# Altium schematic symbol library Schlib.SchLib: 725 symbols (part 5 of 6) (continued)
## TDZ3V6J,115
designator D?  (value not drawn)
Diode Zener Single 3.6V 2% 500mW Automotive 2-Pin SOD-323F T/R; Manufacturer: Nexperia; Manufacturer Part Number: TDZ3V6J,115; Supplier: Digi-Key; Supplier Part Number: 1727-1758-1-ND; RoHS: Yes; Category: Zener Diodes; Stock: 3257; Pricing: 1=0.34000, 10=0.28100, 100=0.14910, 500=0.09810, 1000=0.06671 (USD); RoHS Compliant: Yes; ComponentLink1URL: http://www.farnell.com/datasheets/1508366.pdf?src-supplier=Farnell; ComponentLink1Description: http://www.farnell.com/datasheets/1508366.pdf?src-supplier=Farnell; ComponentLink2URL: https://assets.nexperia.com/documents/data-sheet/TDZXJ_SER.pdf?src-supplier=Digi-Key; ComponentLink2Description: https://assets.nexperia.com/documents/data-sheet/TDZXJ_SER.pdf?src-supplier=Digi-Key; Value: 3.6V
footprint SC-90, SOD-323F
pins: 1 C, 2 A

## TDZ5V1J,115
designator D?  (value not drawn)
Diode Zener Single 5.1V 2% 500mW Automotive 2-Pin SOD-323F T/R; Manufacturer: Nexperia; Manufacturer Part Number: TDZ5V1J,115; Supplier: Digi-Key; Supplier Part Number: 1727-1761-1-ND; RoHS: Yes; Category: Zener Diodes; Stock: 14899; Pricing: 1=0.34000, 10=0.28100, 100=0.14910, 500=0.09810, 1000=0.06671 (USD); RoHS Compliant: Yes; ComponentLink1URL: http://www.farnell.com/datasheets/1508366.pdf?src-supplier=Farnell; ComponentLink1Description: http://www.farnell.com/datasheets/1508366.pdf?src-supplier=Farnell; ComponentLink2URL: https://www.mouser.com/ds/2/302/TDZXJ_SER-119854.pdf?src-supplier=Mouser; ComponentLink2Description: https://www.mouser.com/ds/2/302/TDZXJ_SER-119854.pdf?src-supplier=Mouser; Value: 5.1V; Case/Package: SOD-323F
footprint SC-90, SOD-323F
pins: 1 C, 2 A

## TDZ22J,115
designator D?  (value not drawn)
Diode Zener Single 22V 2% 500mW Automotive 2-Pin SOD-323F T/R; Manufacturer: NXP Semiconductors; Manufacturer Part Number: TDZ22J,115; Max Reverse Leakage Current: 15.4uA; Impedance: 25R; Supplier: Digi-Key; Supplier Part Number: TDZ22J,115-ND; RoHS: Yes; Category: Uncategorized; Mounting Technology: Surface Mount; Pins: 2; Min Operating Temperature: -55°C; Max Operating Temperature: 150°C; Max Power Dissipation: 500mW; Zener Voltage: 22V; Element Configuration: Single; Package Quantity: 3000; Tolerance: 2%; Packaging: Tape and Reel; Power Dissipation: 500mW; Voltage Tolerance: 2%; Radiation Hardening: No; RoHS Compliant: Yes; ComponentLink1URL: https://datasheet.ciiva.com/899/tdzxj-ser-899042.pdf?src-supplier=Digi-Key; ComponentLink1Description: https://datasheet.ciiva.com/899/tdzxj-ser-899042.pdf?src-supplier=Digi-Key; ComponentLink2URL: https://datasheet.ciiva.com/10645/tdzxj-ser-10645782.pdf?src-supplier=Avnet; ComponentLink2Description: https://datasheet.ciiva.com/10645/tdzxj-ser-10645782.pdf?src-supplier=Avnet; Value: 22V
footprint SC-90, SOD-323F
pins: 1 C, 2 A

## TE054003-5
designator BUZ?  (value not drawn)
Electro-mechanical Transducer; Manufacturer: DB Unlimited; Manufacturer Part Number: TE054003-5; Supplier 1: Digi-Key; Stock 1: 2000; Pricing 1: 1=1.49000, 10=1.24100, 25=1.14800, 50=1.08000, 100=1.01430, 500=0.87142, 1000=0.83790 (USD); Supplier Part Number 1: 2104-TE054003-5CT-ND
footprint TE054003-5 (DFN, 4-Leads, Body 5.50x5.50mm, Pitch 3.70mm, IPC Medium Density)
pins: 1 +, 2 -

## TL3330AF260QG
designator B?  (value not drawn)
Switch Tactile N.O. SPST Rectangular Button Gull Wing 0.05A 12VDC 2.55N SMD; Manufacturer: E-Switch; Manufacturer Part Number: TL3330AF260QG; Supplier: Future Electronics; Supplier Part Number: 5021134; RoHS: Yes; Category: Tactile Switches; Stock: 18400; Pricing: 2300=0.265, 4600=0.26, 6900=0.255, 9200=0.25 (USD); ComponentLink1URL: https://datasheet.ciiva.com/2900/p010951-2900788.pdf?src-supplier=Digi-Key; ComponentLink1Description: https://datasheet.ciiva.com/2900/p010951-2900788.pdf?src-supplier=Digi-Key; ComponentLink2URL: https://datasheet.ciiva.com/5284/tl3330-28043-5284129.pdf?src-supplier=Mouser; ComponentLink2Description: https://datasheet.ciiva.com/5284/tl3330-28043-5284129.pdf?src-supplier=Mouser; ComponentLink3URL: https://datasheet.ciiva.com/2900/tl3330-2900789.pdf?src-supplier=Digi-Key; ComponentLink3Description: https://datasheet.ciiva.com/2900/tl3330-2900789.pdf?src-supplier=Digi-Key; ComponentLink4URL: https://datasheet.ciiva.com/2900/tl3330-2900790.pdf?src-supplier=Digi-Key; ComponentLink4Description: https://datasheet.ciiva.com/2900/tl3330-2900790.pdf?src-supplier=Digi-Key
footprint TL3330AF260QG
pins: 1 NO_2, 2 COM_1, S1 NO_1, S2 COM_2

## TLJB157M010R0500
designator C?  value 150uF  (hidden comment: *)
Cap Tant Solid 150uF 10V B CASE 20% (3.5 X 2.8 X 1.9mm) Inward L SMD 3528-21 0.5 Ohm 125C T/R; Manufacturer: Kyocera AVX; Manufacturer Part Number: TLJB157M010R0500; Dielectric Material: Tantalum; ESR (Equivalent Series Resistance): 500mR; Ripple Current: 412mA; Leakage Current: 15uA; Polarity: Polar; Supplier: Digi-Key; Supplier Part Number: 478-3349-1-ND; RoHS: Yes; Category: Tantalum Capacitors; Stock: 229155; Pricing: 1=0.90000, 10=0.66000, 50=0.52760, 100=0.45220, 500=0.35802, 1000=0.30149 (USD); Mounting Technology: Surface Mount,PCB; Case/Package: 1210; Pins: 2; Case Code (Imperial): 1210; Case Code (Metric): 3528; Min Operating Temperature: -55°C; Max Operating Temperature: 125°C; Package Quantity: 2000; Voltage Rating: 10V; Tolerance: 20%; Packaging: Tape and Reel; Voltage Rating (DC): 10V; Termination: SMD/SMT; Voltage: 10V; Features: General Purpose; Series: TLJ; Construction: Flat; Length: 3.5mm; Width: 2.8mm; Height: 1.9mm; Height - Seated (Max): 0.083inch; Depth: 2.8mm; Lead Pitch: 1.4mm; Radiation Hardening: No; Reach SVHC Compliant: Yes; Lead Free: Lead Free; RoHS Compliant: Yes; ComponentLink1URL: https://datasheet.ciiva.com/264/tlj-264787.pdf?src-supplier=Digi-Key; ComponentLink1Description: https://datasheet.ciiva.com/264/tlj-264787.pdf?src-supplier=Digi-Key; ComponentLink2URL: https://datasheet.ciiva.com/46385/1910903-46385237.pdf?src-supplier=Element14; ComponentLink2Description: https://datasheet.ciiva.com/46385/1910903-46385237.pdf?src-supplier=Element14; ComponentLink3URL: https://datasheet.ciiva.com/11229/tlj-11229389.pdf?src-supplier=Avnet; ComponentLink3Description: https://datasheet.ciiva.com/11229/tlj-11229389.pdf?src-supplier=Avnet; ComponentLink4URL: https://datasheet.ciiva.com/264/tlj-264786.pdf?src-supplier=Digi-Key; ComponentLink4Description: https://datasheet.ciiva.com/264/tlj-264786.pdf?src-supplier=Digi-Key; ComponentLink5URL: https://datasheet.ciiva.com/28515/tlj-28515528.pdf?src-supplier=Element14; ComponentLink5Description: https://datasheet.ciiva.com/28515/tlj-28515528.pdf?src-supplier=Element14; ComponentLink6URL: https://datasheet.ciiva.com/14593/70001364-14593673.pdf?src-supplier=Allied+Electronics; ComponentLink6Description: https://datasheet.ciiva.com/14593/70001364-14593673.pdf?src-supplier=Allied+Electronics; ComponentLink7URL: https://datasheet.ciiva.com/264/tlj-264788.pdf?src-supplier=Digi-Key; ComponentLink7Description: https://datasheet.ciiva.com/264/tlj-264788.pdf?src-supplier=Digi-Key; ComponentLink8URL: https://datasheet.ciiva.com/7773/1533257-7773833.pdf?src-supplier=Element14; ComponentLink8Description: https://datasheet.ciiva.com/7773/1533257-7773833.pdf?src-supplier=Element14; ComponentLink9URL: https://datasheet.ciiva.com/14606/70001364-14606409.pdf?src-supplier=Allied+Electronics; ComponentLink9Description: https://datasheet.ciiva.com/14606/70001364-14606409.pdf?src-supplier=Allied+Electronics; ComponentLink10URL: https://datasheet.ciiva.com/7773/1533257-7773834.pdf?src-supplier=Element14; ComponentLink10Description: https://datasheet.ciiva.com/7773/1533257-7773834.pdf?src-supplier=Element14
footprint Tantal 1210 (Molded Capacitor, 2-Leads, Body 3.50x2.80mm, IPC Medium Density)
pins: 1 P, 2 N

## TLP2270(TP4,E
designator U?  (value not drawn)
Optocoupler Logic-Out Totem-Pole DC-IN 2-CH 8-Pin SOIC; Manufacturer: Toshiba; Manufacturer Part Number: TLP2270(TP4,E; Supplier: Avnet; Supplier Part Number: TLP2270(TP4,E; RoHS: Yes; Category: Optocouplers; Stock: 10500; Pricing: 1500=1.3311, 3000=1.2963, 6000=1.2354, 9000=1.2006, 12000=1.1745, 15000=1.1397, 150000=1.1136 (USD); RoHS Compliant: Yes
footprint TLP2270(TP4,E
pins: 1 A1, 2 C1, 3 C2, 4 A2, 5 GND, 6 Vo2, 7 Vo1, 8 VDD

## TLV3201AIDBVT
designator U?  (value not drawn)
5.5-V, high-speed, single push-pull comparator 5-SOT-23 -40 to 125; Manufacturer: Texas Instruments; Manufacturer Part Number: TLV3201AIDBVT; Manufacturer Lifecycle Status: ACTIVE; Common Mode Rejection Ratio: 70dB; Hysteresis: 1.2mV; Input Bias Current: 5nA; Input Offset Voltage (Vos): 5mV; Max Supply Current: 40µA; Max Supply Voltage: 5.5V; Min Supply Voltage: 2.7V; Nominal Supply Current: 50µA; Number of Channels: 1; Power Supply Rejection Ratio (PSRR): 85dB; Propagation Delay: 50ns; Response Time: 47ns; Supplier: Arrow Electronics; Supplier Part Number: TLV3201AIDBVT; RoHS: Compliant; Category: Amplifiers - Op Amps, Buffer, Instrumentation; Stock: 1; Pricing: 1=0.365 (USD); Case/Package: SOT-23; Contact Plating: Gold; Height: 1.45mm; Lead Free: Lead Free; Length: 2.9mm; Lifecycle Status: Production; Max Input Current: 5nA; Max Operating Temperature: 125°C; Min Operating Temperature: -40°C; Mounting Technology: Surface Mount; Number of Elements: 1; Pins: 5; Quiescent Current: 40µA; Radiation Hardening: No; REACH SVHC: No; Schedule B: 8542390000, 8542390000|8542390000, 8542390000|8542390000|8542390000, 8542390000|8542390000|8542390000|8542390000; Thickness: 1.2mm; Type: General Purpose; Width: 1.6mm; ComponentLink1URL: https://sigma.octopart.com:443/177332311/technical_drawing/Texas-Instruments-TLV3201AIDBVT.pdf?src-supplier=Texas+Instruments; ComponentLink1Description: https://sigma.octopart.com:443/177332311/technical_drawing/Texas-Instruments-TLV3201AIDBVT.pdf?src-supplier=Texas+Instruments; ComponentLink2URL: https://octopart.com:443/opatz8j6/c1?t=2vYj1qybP85R42PSUDwDONm9QTJGmWWDeqlWX6R7n31u9wp2wYqVPtCHbjylz0xekjg_po4rVVa2AwJl8eWf1XKT56o8-lWyjI0WNm2mqUuIXo78aiM58K-f9u1mjfwqEZY4xTxthA6dd2om9C-s-SpA86zAToBfNtxMXduUy7wlH0rrFj5KFPvfMwEV85eJP5rY-7yR8Qg0X9Ri0bG1n0PE1KqX8jMBPC0_6-OxyZrXZehNzqgP8dyogx5HXmVuMmjHJpQkbYRuhgu-Gy9h0rVT5CcMvtcKT2BoMGEwKJ6R-eLAXsUSmnhfCEBvvW92J-UEmyxkzSUUTNRf0S9Cx_50D-GzlCMd3JnSMazxJtNHUhhnY62JbgKdMxTJjs-ZCDAjAhM&src-supplier=Texas+Instruments; ComponentLink2Description: https://octopart.com:443/opatz8j6/c1?t=2vYj1qybP85R42PSUDwDONm9QTJGmWWDeqlWX6R7n31u9wp2wYqVPtCHbjylz0xekjg_po4rVVa2AwJl8eWf1XKT56o8-lWyjI0WNm2mqUuIXo78aiM58K-f9u1mjfwqEZY4xTxthA6dd2om9C-s-SpA86zAToBfNtxMXduUy7wlH0rrFj5KFPvfMwEV85eJP5rY-7yR8Qg0X9Ri0bG1n0PE1KqX8jMBPC0_6-OxyZrXZehNzqgP8dyogx5HXmVuMmjHJpQkbYRuhgu-Gy9h0rVT5CcMvtcKT2BoMGEwKJ6R-eLAXsUSmnhfCEBvvW92J-UEmyxkzSUUTNRf0S9Cx_50D-GzlCMd3JnSMazxJtNHUhhnY62JbgKdMxTJjs-ZCDAjAhM&src-supplier=Texas+Instruments; ComponentLink3URL: https://sigma.octopart.com:443/175570406/technical_drawing/Texas-Instruments-TLV3201AIDBVT.pdf?src-supplier=Texas+Instruments; ComponentLink3Description: https://sigma.octopart.com:443/175570406/technical_drawing/Texas-Instruments-TLV3201AIDBVT.pdf?src-supplier=Texas+Instruments; ComponentLink4URL: https://sigma.octopart.com:443/169406034/technical_drawing/Texas-Instruments-TLV3201AIDBVT.pdf?src-supplier=Texas+Instruments; ComponentLink4Description: https://sigma.octopart.com:443/169406034/technical_drawing/Texas-Instruments-TLV3201AIDBVT.pdf?src-supplier=Texas+Instruments; ComponentLink5URL: https://sigma.octopart.com:443/155939316/technical_drawing/Texas-Instruments-TLV3201AIDBVT.pdf?src-supplier=Texas+Instruments; ComponentLink5Description: https://sigma.octopart.com:443/155939316/technical_drawing/Texas-Instruments-TLV3201AIDBVT.pdf?src-supplier=Texas+Instruments; ComponentLink6URL: https://sigma.octopart.com:443/102331370/technical_drawing/Texas-Instruments-TLV3201AIDBVT.pdf?src-supplier=Texas+Instruments; ComponentLink6Description: https://sigma.octopart.com:443/102331370/technical_drawing/Texas-Instruments-TLV3201AIDBVT.pdf?src-supplier=Texas+Instruments; ComponentLink7URL: https://sigma.octopart.com:443/49249325/technical_drawing/Texas-Instruments-TLV3201AIDBVT.pdf?src-supplier=Texas+Instruments; ComponentLink7Description: https://sigma.octopart.com:443/49249325/technical_drawing/Texas-Instruments-TLV3201AIDBVT.pdf?src-supplier=Texas+Instruments; ComponentLink8URL: https://datasheet.octopart.com:443/TLV3201AIDBVT-Texas-Instruments-datasheet-11515870.pdf?src-supplier=Texas+Instruments; ComponentLink8Description: https://datasheet.octopart.com:443/TLV3201AIDBVT-Texas-Instruments-datasheet-11515870.pdf?src-supplier=Texas+Instruments; ComponentLink9URL: https://datasheet.octopart.com:443/TLV3201AIDBVT-Texas-Instruments-datasheet-10947357.pdf?src-supplier=Texas+Instruments; ComponentLink9Description: https://datasheet.octopart.com:443/TLV3201AIDBVT-Texas-Instruments-datasheet-10947357.pdf?src-supplier=Texas+Instruments; ComponentLink10URL: https://datasheet.octopart.com:443/TLV3201AIDBVT-Texas-Instruments-datasheet-37140356.pdf?src-supplier=Farnell; ComponentLink10Description: https://datasheet.octopart.com:443/TLV3201AIDBVT-Texas-Instruments-datasheet-37140356.pdf?src-supplier=Farnell; ComponentLink11URL: https://datasheet.octopart.com:443/TLV3201AIDBVT-Texas-Instruments-datasheet-11761733.pdf?src-supplier=Newark; ComponentLink11Description: https://datasheet.octopart.com:443/TLV3201AIDBVT-Texas-Instruments-datasheet-11761733.pdf?src-supplier=Newark; ComponentLink12URL: https://datasheet.octopart.com:443/TLV3201AIDBVT-Texas-Instruments-datasheet-33022092.pdf?src-supplier=Newark; ComponentLink12Description: https://datasheet.octopart.com:443/TLV3201AIDBVT-Texas-Instruments-datasheet-33022092.pdf?src-supplier=Newark; ComponentLink13URL: https://datasheet.octopart.com:443/TLV3201AIDBVT-Texas-Instruments-datasheet-164418918.pdf?src-supplier=SHENGYU+ELECTRONICS; ComponentLink13Description: https://datasheet.octopart.com:443/TLV3201AIDBVT-Texas-Instruments-datasheet-164418918.pdf?src-supplier=SHENGYU+ELECTRONICS; ComponentLink14URL: https://datasheet.octopart.com:443/TLV3201AIDBVT-Texas-Instruments-datasheet-81455961.pdf?src-supplier=TME; ComponentLink14Description: https://datasheet.octopart.com:443/TLV3201AIDBVT-Texas-Instruments-datasheet-81455961.pdf?src-supplier=TME; ComponentLink15URL: http://sigma.octopart.com:80/reach_statement/Texas-Instruments-company-64.pdf?src-supplier=Compliance+Statements; ComponentLink15Description: http://sigma.octopart.com:80/reach_statement/Texas-Instruments-company-64.pdf?src-supplier=Compliance+Statements; ComponentLink16URL: http://sigma.octopart.com:80/conflict_mineral_statement/Texas-Instruments-company-63.pdf?src-supplier=Compliance+Statements; ComponentLink16Description: http://sigma.octopart.com:80/conflict_mineral_statement/Texas-Instruments-company-63.pdf?src-supplier=Compliance+Statements
footprint SOT-23-5
pins: 1, 2, 3, 4, 5
text: +; -

## TLV3201AIDCKT
designator U?  (value not drawn)
5.5-V, high-speed, single push-pull comparator 5-SC70 -40 to 125; Manufacturer: Texas Instruments; Manufacturer Part Number: TLV3201AIDCKT; Manufacturer Lifecycle Status: ACTIVE; Common Mode Rejection Ratio: 70dB; Hysteresis: 1.2mV; Input Bias Current: 1pA; Input Offset Voltage (Vos): 1mV; Max Dual Supply Voltage: 2.75V; Max Input Current: 5nA; Max Junction Temperature (Tj): 150°C; Max Supply Current: 40µA; Max Supply Voltage: 5.5V; Min Dual Supply Voltage: 1.35V; Min Supply Voltage: 2.7V; Nominal Supply Current: 50µA; Number of Channels: 1; Output Current per Channel: 48mA; Power Supply Rejection Ratio (PSRR): 85dB; Propagation Delay: 50ns; Response Time: 40ns; Supplier: Arrow Electronics; Supplier Part Number: TLV3201AIDCKT; RoHS: Compliant; Category: Comparators; Stock: 231; Pricing: 1=1.092, 10=0.928, 25=0.874, 100=0.734 (USD); Case/Package: SC; Contact Plating: Gold; Height: 1.1mm; Lead Free: Lead Free; Length: 2mm; Lifecycle Status: Production; Max Operating Temperature: 125°C; Min Operating Temperature: -40°C; Mounting Technology: Surface Mount; Number of Elements: 1; Pins: 5; Quiescent Current: 40µA; Radiation Hardening: No; REACH SVHC: No; Schedule B: 8542390000, 8542390000|8542390000|8542390000|8542390000|8542390000; Thickness: 900µm; Type: General Purpose; Width: 1.25mm; ComponentLink1URL: https://sigma.octopart.com:443/182282879/technical_drawing/Texas-Instruments-TLV3201AIDCKT.pdf?src-supplier=Texas+Instruments; ComponentLink1Description: https://sigma.octopart.com:443/182282879/technical_drawing/Texas-Instruments-TLV3201AIDCKT.pdf?src-supplier=Texas+Instruments; ComponentLink2URL: https://octopart.com:443/opatz8j6/c1?t=0YiOlHvn6IAuunCIKdjqF0B2t0hslJ71VHy3--cHUUZ8_1M2AdMluaXtAVOVTKRGTYLwvYVc6yZ3q_Bgg0GYQnVaPR5DUzvbeQyE5XtDVIeMgAY-jQ4PK7gzPZO7WtF2MNbyRsk84lRSyjoULzwiR04MWuOaW7u_0a6H-27epDdXQrynAdIx1htCieGeEd0lHGPyYj04cE5Evd5pVpesiYndIh2-tjM3Gsw7CV_nn6iuTa1MdqyOkGeJGHAM_U6d5M7Khs80HR5Wd8Gyc6q5yf0h6c1A1wpc7-SXCfgelJFNDYL9SWTIZV4JsLo2wQNnZ125CWNfldHyIF44bZjSHfhCkUtgmT7ktFHG6cLVoZ6QEJSe1KhGep6POxnYgz9jCgG-9y8&src-supplier=Texas+Instruments; ComponentLink2Description: https://octopart.com:443/opatz8j6/c1?t=0YiOlHvn6IAuunCIKdjqF0B2t0hslJ71VHy3--cHUUZ8_1M2AdMluaXtAVOVTKRGTYLwvYVc6yZ3q_Bgg0GYQnVaPR5DUzvbeQyE5XtDVIeMgAY-jQ4PK7gzPZO7WtF2MNbyRsk84lRSyjoULzwiR04MWuOaW7u_0a6H-27epDdXQrynAdIx1htCieGeEd0lHGPyYj04cE5Evd5pVpesiYndIh2-tjM3Gsw7CV_nn6iuTa1MdqyOkGeJGHAM_U6d5M7Khs80HR5Wd8Gyc6q5yf0h6c1A1wpc7-SXCfgelJFNDYL9SWTIZV4JsLo2wQNnZ125CWNfldHyIF44bZjSHfhCkUtgmT7ktFHG6cLVoZ6QEJSe1KhGep6POxnYgz9jCgG-9y8&src-supplier=Texas+Instruments; ComponentLink3URL: https://sigma.octopart.com:443/179129132/technical_drawing/Texas-Instruments-TLV3201AIDCKT.pdf?src-supplier=Texas+Instruments; ComponentLink3Description: https://sigma.octopart.com:443/179129132/technical_drawing/Texas-Instruments-TLV3201AIDCKT.pdf?src-supplier=Texas+Instruments; ComponentLink4URL: https://sigma.octopart.com:443/176385615/technical_drawing/Texas-Instruments-TLV3201AIDCKT.pdf?src-supplier=Texas+Instruments; ComponentLink4Description: https://sigma.octopart.com:443/176385615/technical_drawing/Texas-Instruments-TLV3201AIDCKT.pdf?src-supplier=Texas+Instruments; ComponentLink5URL: https://sigma.octopart.com:443/169406035/technical_drawing/Texas-Instruments-TLV3201AIDCKT.pdf?src-supplier=Texas+Instruments; ComponentLink5Description: https://sigma.octopart.com:443/169406035/technical_drawing/Texas-Instruments-TLV3201AIDCKT.pdf?src-supplier=Texas+Instruments; ComponentLink6URL: https://datasheet.octopart.com:443/TLV3201AIDCKT-Texas-Instruments-datasheet-11515870.pdf?src-supplier=Texas+Instruments; ComponentLink6Description: https://datasheet.octopart.com:443/TLV3201AIDCKT-Texas-Instruments-datasheet-11515870.pdf?src-supplier=Texas+Instruments; ComponentLink7URL: https://datasheet.octopart.com:443/TLV3201AIDCKT-Texas-Instruments-datasheet-10947357.pdf?src-supplier=Texas+Instruments; ComponentLink7Description: https://datasheet.octopart.com:443/TLV3201AIDCKT-Texas-Instruments-datasheet-10947357.pdf?src-supplier=Texas+Instruments; ComponentLink8URL: https://sigma.octopart.com:443/49249326/technical_drawing/Texas-Instruments-TLV3201AIDCKT.pdf?src-supplier=Texas+Instruments; ComponentLink8Description: https://sigma.octopart.com:443/49249326/technical_drawing/Texas-Instruments-TLV3201AIDCKT.pdf?src-supplier=Texas+Instruments; ComponentLink9URL: https://datasheet.octopart.com:443/TLV3201AIDCKT-Texas-Instruments-datasheet-37140356.pdf?src-supplier=element14+APAC; ComponentLink9Description: https://datasheet.octopart.com:443/TLV3201AIDCKT-Texas-Instruments-datasheet-37140356.pdf?src-supplier=element14+APAC; ComponentLink10URL: https://datasheet.octopart.com:443/TLV3201AIDCKT-Texas-Instruments-datasheet-149152627.pdf?src-supplier=Upverter; ComponentLink10Description: https://datasheet.octopart.com:443/TLV3201AIDCKT-Texas-Instruments-datasheet-149152627.pdf?src-supplier=Upverter; ComponentLink11URL: https://datasheet.octopart.com:443/TLV3201AIDCKT-Texas-Instruments-datasheet-11538948.pdf?src-supplier=Newark; ComponentLink11Description: https://datasheet.octopart.com:443/TLV3201AIDCKT-Texas-Instruments-datasheet-11538948.pdf?src-supplier=Newark; ComponentLink12URL: https://datasheet.octopart.com:443/TLV3201AIDCKT-Texas-Instruments-datasheet-36780071.pdf?src-supplier=Newark; ComponentLink12Description: https://datasheet.octopart.com:443/TLV3201AIDCKT-Texas-Instruments-datasheet-36780071.pdf?src-supplier=Newark; ComponentLink13URL: https://datasheet.octopart.com:443/TLV3201AIDCKT-Texas-Instruments-datasheet-33012511.pdf?src-supplier=Newark; ComponentLink13Description: https://datasheet.octopart.com:443/TLV3201AIDCKT-Texas-Instruments-datasheet-33012511.pdf?src-supplier=Newark; ComponentLink14URL: https://datasheet.octopart.com:443/TLV3201AIDCKT-Texas-Instruments-datasheet-17728500.pdf?src-supplier=Newark; ComponentLink14Description: https://datasheet.octopart.com:443/TLV3201AIDCKT-Texas-Instruments-datasheet-17728500.pdf?src-supplier=Newark; ComponentLink15URL: https://datasheet.octopart.com:443/TLV3201AIDCKT-Texas-Instruments-datasheet-164418918.pdf?src-supplier=SHENGYU+ELECTRONICS; ComponentLink15Description: https://datasheet.octopart.com:443/TLV3201AIDCKT-Texas-Instruments-datasheet-164418918.pdf?src-supplier=SHENGYU+ELECTRONICS; ComponentLink16URL: https://datasheet.octopart.com:443/TLV3201AIDCKT-Texas-Instruments-datasheet-81455961.pdf?src-supplier=TME; ComponentLink16Description: https://datasheet.octopart.com:443/TLV3201AIDCKT-Texas-Instruments-datasheet-81455961.pdf?src-supplier=TME; ComponentLink17URL: https://datasheet.octopart.com:443/TLV3201AIDCKT-Texas-Instruments-datasheet-140571711.pdf?src-supplier=Arrow.cn; ComponentLink17Description: https://datasheet.octopart.com:443/TLV3201AIDCKT-Texas-Instruments-datasheet-140571711.pdf?src-supplier=Arrow.cn; ComponentLink18URL: https://datasheet.octopart.com:443/TLV3201AIDCKT-Texas-Instruments-datasheet-11549733.pdf?src-supplier=Arrow+Electronics; ComponentLink18Description: https://datasheet.octopart.com:443/TLV3201AIDCKT-Texas-Instruments-datasheet-11549733.pdf?src-supplier=Arrow+Electronics; ComponentLink19URL: http://sigma.octopart.com:80/reach_statement/Texas-Instruments-company-64.pdf?src-supplier=Compliance+Statements; ComponentLink19Description: http://sigma.octopart.com:80/reach_statement/Texas-Instruments-company-64.pdf?src-supplier=Compliance+Statements; ComponentLink20URL: http://sigma.octopart.com:80/conflict_mineral_statement/Texas-Instruments-company-63.pdf?src-supplier=Compliance+Statements; ComponentLink20Description: http://sigma.octopart.com:80/conflict_mineral_statement/Texas-Instruments-company-63.pdf?src-supplier=Compliance+Statements
footprint SC-70-5
pins: 1, 2, 3, 4, 5
text: +; -

## TLV70018DCKT
designator U?  (value not drawn)
IC, LDO, 200MA, 1.8V, 5SC70; Input Voltage Min:2V; Input Voltage Max:5.5V; Output Voltage Nom.:1.8V; Output Current:200mA; Dropout Voltage Vdo:175mV; LDO Regulator Case Style:SC-70; No. of Pins:5; Operating Temperature Min:-40°C; ;RoHS Compliant: Yes; Manufacturer: Texas Instruments; Manufacturer Part Number: TLV70018DCKT; Dropout Voltage: 175mV; Number of Outputs: 1; Max Power Dissipation: 320mW; Max Supply Voltage: 5.5V; Min Input Voltage: 2V; Min Current Limit: 220mA; Polarity: Positive; Quiescent Current: 30uA; Accuracy: 2%; Max Supply Current: 270uA; Nominal Supply Current: 31uA; Output Type: Fixed; Power Supply Rejection Ratio (PSRR): 68dB; Supplier: Digi-Key; Supplier Part Number: 296-25269-1-ND; RoHS: Yes; Category: Voltage Regulators - Linear; Stock: 6750; Pricing: 1=1.08000, 10=0.96600, 25=0.91720, 100=0.75330 (USD); Case/Package: SC; Pins: 5; Contact Plating: Gold; Min Operating Temperature: -40°C; Max Operating Temperature: 125°C; Output Current: 200mA; Nominal Output Voltage: 1.8V; Packaging: Tape and Reel; Output Voltage: 1.8V; Package Quantity: 250; Max Output current: 200mA; Number of Regulators: 1; Power Dissipation: 320mW; Min Output Voltage: 1.8V; Power Rating: 320mW; Output Voltage Accuracy: 2%; Max Output Voltage: 1.8V; Series: -; Supply Current: 31uA; Output Configuration: Positive; Length: 2.15mm; Width: 1.4mm; Height: 1mm; Radiation Hardening: No; Reach SVHC Compliant: Yes; Lead Free: Lead Free; RoHS Compliant: Yes; ComponentLink1URL: https://datasheet.ciiva.com/14149/tlv700-eng-ds-14149837.pdf?src-supplier=Distrelec; ComponentLink1Description: https://datasheet.ciiva.com/14149/tlv700-eng-ds-14149837.pdf?src-supplier=Distrelec; ComponentLink2URL: https://datasheet.ciiva.com/7992/1882059-7992894.pdf?src-supplier=Element14; ComponentLink2Description: https://datasheet.ciiva.com/7992/1882059-7992894.pdf?src-supplier=Element14; ComponentLink3URL: https://datasheet.ciiva.com/22700/1882059-22700171.pdf?src-supplier=Element14; ComponentLink3Description: https://datasheet.ciiva.com/22700/1882059-22700171.pdf?src-supplier=Element14
footprint SC-70-5
pins: 1 IN, 2 GND, 3 EN, 4 NC, 5 OUT

## TMCP1D104MTRF
designator *  value 100nF
Surface Mount Tantalum Capacitor, 0.1 uF, 20 V, ± 20%, -55 °C, 125 °C, 0805 [2012-12 Metric]; Manufacturer: Vishay; Manufacturer Part Number: TMCP1D104MTRF; ESR (Equivalent Series Resistance): 33Ω; Leakage Current: 500nA; Ripple Current: 17.6mA; Voltage Rating (DC): 20V; Supplier: Farnell; Supplier Part Number: 3369501; RoHS: Compliant; Category: Tantalum Capacitors; Stock: 1206; Pricing: 5=0.262, 50=0.115, 250=0.102, 500=0.0847, 1500=0.0789 (GBP); Height: 1.2mm; Length: 2mm; Lifecycle Status: Production; Max Operating Temperature: 125°C; Min Operating Temperature: -55°C; Mounting Technology: Surface Mount; Number of Terminals: 2; REACH SVHC: Yes; Width: 1.25mm; ComponentLink1URL: https://datasheet.octopart.com:443/TMCP1D104MTRF-Vishay-datasheet-181963500.pdf?src-supplier=Newark; ComponentLink1Description: https://datasheet.octopart.com:443/TMCP1D104MTRF-Vishay-datasheet-181963500.pdf?src-supplier=Newark; ComponentLink2URL: https://datasheet.octopart.com:443/TMCP1D104MTRF-Vishay-datasheet-182031434.pdf?src-supplier=IHS; ComponentLink2Description: https://datasheet.octopart.com:443/TMCP1D104MTRF-Vishay-datasheet-182031434.pdf?src-supplier=IHS; ComponentLink3URL: https://datasheet.octopart.com:443/TMCP1D104MTRF-Vishay-datasheet-79472417.pdf?src-supplier=Future+Electronics; ComponentLink3Description: https://datasheet.octopart.com:443/TMCP1D104MTRF-Vishay-datasheet-79472417.pdf?src-supplier=Future+Electronics; ComponentLink4URL: http://sigma.octopart.com:80/rohs_statement/Vishay-company-15.pdf?src-supplier=Compliance+Statements; ComponentLink4Description: http://sigma.octopart.com:80/rohs_statement/Vishay-company-15.pdf?src-supplier=Compliance+Statements
pins: 1 P, 2 N

## TMP117AIDRVR
designator U?  (value not drawn)
0.1°C digital temperature sensor, 48-bit EEPROM, PT100/PT1000 RTD replacement 6-WSON -55 to 150; Manufacturer: Texas Instruments; Manufacturer Part Number: TMP117AIDRVR; Interface: 39,4268,4478Interface; Max Supply Voltage: 5.5V; Min Supply Voltage: 1.8V; Supplier: Mouser; Supplier Part Number: 595-TMP117AIDRVR; RoHS: Yes; Category: Integrated Circuits (ICs); Stock: 10747; Pricing: 1=5.19, 10=4.13, 50=4.13, 100=3.85, 1000=3.08, 10000=2.74 (USD); Pins: 6NUMBER; Length: 2mm; Width: 2mm; Height: 800um; Thickness: 750um; ComponentLink1URL: http://www.ti.com/lit/gpn/tmp117?src-supplier=Digikey; ComponentLink1Description: http://www.ti.com/lit/gpn/tmp117?src-supplier=Digikey; ComponentLink2URL: http://www.ti.com/lit/ds/symlink/tmp117.pdf?src-supplier=Digikey; ComponentLink2Description: http://www.ti.com/lit/ds/symlink/tmp117.pdf?src-supplier=Digikey
footprint TMP117AIDRVR
pins: 1 SCL, 2 GND, 3 ALERT, 4 ADD0, 5 V+, 6 SDA, 7 EXP

## TMP1075DSGR
designator *
Serial Switch/Digital Sensor, 12 Bit(s), 2Cel, Square, Surface Mount; Manufacturer: Texas Instruments; Manufacturer Part Number: TMP1075DSGR; Interface: 39,4268Interface; Max Supply Voltage: 5.5V; Min Supply Voltage: 1.7V; Supplier: Mouser; Supplier Part Number: 595-TMP1075DSGR; RoHS: Yes; Category: Integrated Circuits (ICs); Stock: 8700; Pricing: 1=0.64, 10=0.409, 50=0.409, 100=0.341, 1000=0.263, 10000=0.214 (USD); Pins: 8NUMBER; Length: 2mm; Width: 2mm; Height: 800um; Thickness: 750um; ComponentLink1URL: http://www.ti.com/general/docs/suppproductinfo.tsp?distId=10&amp;gotoUrl=http%3A%2F%2Fwww.ti.com%2Flit%2Fgpn%2Ftmp1075&src-supplier=Digikey; ComponentLink1Description: http://www.ti.com/general/docs/suppproductinfo.tsp?distId=10&amp;gotoUrl=http%3A%2F%2Fwww.ti.com%2Flit%2Fgpn%2Ftmp1075&src-supplier=Digikey
pins: 1 SDA, 2 SCL, 3 ALERT, 4 GND, 5 A2, 6 A1, 7 A0, 8 V+

## TMP1075NDRLR
designator U?  (value not drawn)
Serial Switch/Digital Sensor, 12 Bit(s), 2Cel, Rectangular, 6 Pin, Surface Mount; Manufacturer: Texas Instruments; Manufacturer Part Number: TMP1075NDRLR; Supplier: Mouser; Supplier Part Number: 595-TMP1075NDRLR; RoHS: No; Category: Linear ICs; Stock: 16509; Pricing: 1=0.5, 10=0.386, 50=0.386, 100=0.351, 1000=0.276, 10000=0.209 (USD); Pins: 6NUMBER; Length: 1.6mm; Width: 1.2mm; Height: 600um; Thickness: 550um; RoHS Compliant: 5897YesNo
footprint SOT-563, SOT-666
pins: 1 SCL, 2 GND, 3 ALERT, 4 A0, 5 V+, 6 SDA

## TNPW04029K76BEED
designator R?  value 9.76kR  Tolerance: 0.1%  (hidden comment: *)
SMD Chip Resistor, 9.76 kOhm, ± 0.1%, 100 mW, 0402 [1005 Metric], Thin Film, High Stability; Manufacturer: Vishay Dale; Manufacturer Part Number: TNPW04029K76BEED; Max Power Dissipation: 100mW; Temperature Coefficient: 25ppm/°C; Supplier: Mouser; Supplier Part Number: 71-TNPW04029K76BEED; RoHS: Yes; Category: Chip SMD Resistors; Stock: 13359; Pricing: 1=0.37, 10=0.271, 50=0.209, 100=0.186, 1000=0.113, 10000=0.1 (USD); Case/Package: 0402; Case Code (Imperial): 0402; Contact Plating: Tin; Min Operating Temperature: -55°C; Max Operating Temperature: 155°C; Package Quantity: 10000; Packaging: Tape and Reel; Number of Terminations: 2; Features: Moisture Resistant,Automotive AEC-Q200,Anti-Sulfur; Series: TNPW e3; Length: 0.039inch; Width: 0.02inch; Height: 0.016inch; Ratings: AEC-Q200; Radiation Hardening: No; RoHS Compliant: Yes; ComponentLink1URL: https://datasheet.ciiva.com/9053/tnpw-e3-9053006.pdf?src-supplier=Avnet; ComponentLink1Description: https://datasheet.ciiva.com/9053/tnpw-e3-9053006.pdf?src-supplier=Avnet; ComponentLink2URL: https://datasheet.ciiva.com/2608/tnpw-e3-2608016.pdf?src-supplier=Digikey; ComponentLink2Description: https://datasheet.ciiva.com/2608/tnpw-e3-2608016.pdf?src-supplier=Digikey
footprint R 0402 (1005 Metric) (Chip Capacitor, Body 1.0x0.5mm, IPC High Density)
pins: 1 B, 2 A

## TNPW040210K0BEED
designator R?  value 10kR  (hidden comment: *)
Res Thin Film 0402 10K Ohm 0.1% 1/10W ±25ppm/°C Molded SMD SMD Paper T/R; Manufacturer: Vishay Dale; Manufacturer Part Number: TNPW040210K0BEED; Power Rating: 63mW; Voltage Rating: 50V; Supplier: Digi-Key; Supplier Part Number: TNP10.0KDACT-ND; RoHS: Yes; Category: Chip SMD Resistors; Stock: 1306157; Pricing: 1=0.59000, 10=0.42000, 100=0.21840, 500=0.15120, 1000=0.11760, 2500=0.11340, 5000=0.11172 (USD); Mounting Technology: Surface Mount; Case/Package: 0402; Case Code (Imperial): 0402; Case Code (Metric): 1005; Weight: 2.3E-05oz; Contact Plating: Tin; Min Operating Temperature: -55°C; Max Operating Temperature: 125°C; Packaging: Tape and Reel; Package Quantity: 1; Termination: SMD/SMT; Resistor Type: Thin Film; Number of Terminations: 2; Temperature Coefficient: 25ppm/°C; Max Power Dissipation: 63mW; Features: Moisture Resistant,Automotive AEC-Q200,Anti-Sulfur; Series: TNPW; Resistance Tolerance: 0.1%; Construction: Rectangular; Length: 1mm; Width: 0.5mm; Height: 0.016inch; Depth: 0.5mm; Radiation Hardening: No; Military Standard: Not; RoHS Compliant: Yes; ComponentLink1URL: https://datasheet.ciiva.com/2502/tnpw-e3-2502402.pdf?src-supplier=Digi-Key; ComponentLink1Description: https://datasheet.ciiva.com/2502/tnpw-e3-2502402.pdf?src-supplier=Digi-Key; ComponentLink2URL: https://datasheet.ciiva.com/2502/tnpw-e3-2502403.pdf?src-supplier=Digi-Key; ComponentLink2Description: https://datasheet.ciiva.com/2502/tnpw-e3-2502403.pdf?src-supplier=Digi-Key; ComponentLink3URL: https://datasheet.ciiva.com/2502/tnpw-e3-2502404.pdf?src-supplier=Digi-Key; ComponentLink3Description: https://datasheet.ciiva.com/2502/tnpw-e3-2502404.pdf?src-supplier=Digi-Key; ComponentLink4URL: https://datasheet.ciiva.com/7743/tnpw-e3-7743787.pdf?src-supplier=Element14; ComponentLink4Description: https://datasheet.ciiva.com/7743/tnpw-e3-7743787.pdf?src-supplier=Element14; ComponentLink5URL: https://datasheet.ciiva.com/46447/tnpw-e3-46447293.pdf?src-supplier=Element14; ComponentLink5Description: https://datasheet.ciiva.com/46447/tnpw-e3-46447293.pdf?src-supplier=Element14
footprint R 0402 (1005 Metric) (Chip Capacitor, Body 1.0x0.5mm, IPC High Density)
pins: 1 B, 2 A

## TNPW040232K0BEED
designator R?  value 32kR  Resistance Tolerance: 0.1%  (hidden comment: *)
SMD Chip Resistor, 32 kOhm, ± 0.1%, 100 mW, 0402 [1005 Metric], Thin Film, High Stability; Manufacturer: Vishay Dale; Manufacturer Part Number: TNPW040232K0BEED; Supplier: Mouser; Supplier Part Number: 71-TNPW040232K0BEED; RoHS: Yes; Category: Chip SMD Resistors; Stock: 21931; Pricing: 1=0.35, 10=0.243, 50=0.193, 100=0.171, 1000=0.114, 10000=0.1 (USD); ComponentLink1URL: https://datasheet.ciiva.com/9017/tnpw-e3-9017983.pdf?src-supplier=Avnet; ComponentLink1Description: https://datasheet.ciiva.com/9017/tnpw-e3-9017983.pdf?src-supplier=Avnet; Case/Package: 0402
footprint R 0402 (1005 Metric) (Chip Capacitor, Body 1.0x0.5mm, IPC High Density)
pins: 1 B, 2 A

## TNPW040273K2BEED
designator R?  value 73.2kR  (hidden comment: *)
Res Thin Film 0402 73.2K Ohm 0.1% 1/10W ±25ppm/°C Molded SMD SMD Paper T/R; Manufacturer: Vishay Dale; Manufacturer Part Number: TNPW040273K2BEED; Max Power Dissipation: 63mW; Supplier: Digi-Key; Supplier Part Number: 541-TNPW040273K2BEEDCT-ND; RoHS: Yes; Category: Chip SMD Resistors; Stock: 51653; Pricing: 1=0.59000, 10=0.42000, 100=0.21840, 500=0.15120, 1000=0.11760, 2500=0.11340, 5000=0.11172 (USD); Case/Package: 0402; Contact Plating: Tin; Min Operating Temperature: -55°C; Max Operating Temperature: 125°C; Package Quantity: 10000; Packaging: Tape and Reel; Tolerance: 0.1%; Resistor Type: Thin Film; Number of Terminations: 2; Temperature Coefficient: 25ppm/°C; Features: Moisture Resistant,Automotive AEC-Q200,Anti-Sulfur; Series: TNPW; Length: 0.039inch; Width: 0.02inch; Height: 0.016inch; Radiation Hardening: No; RoHS Compliant: Yes; ComponentLink1URL: https://datasheet.ciiva.com/8991/tnpw-e3-8991278.pdf?src-supplier=Avnet; ComponentLink1Description: https://datasheet.ciiva.com/8991/tnpw-e3-8991278.pdf?src-supplier=Avnet; ComponentLink2URL: https://datasheet.ciiva.com/2608/tnpw-e3-2608082.pdf?src-supplier=Digi-Key; ComponentLink2Description: https://datasheet.ciiva.com/2608/tnpw-e3-2608082.pdf?src-supplier=Digi-Key
footprint R 0402 (1005 Metric) (Chip Capacitor, Body 1.0x0.5mm, IPC High Density)
pins: 1 B, 2 A

## TNPW0402280RBEED
designator R?  value 280R  Tolerance: 0.1%  (hidden comment: *)
Res Thin Film 0402 280Ohm 0.1% 1/10W 25ppm/K 2-Pin SMD; Manufacturer: Vishay Dale; Manufacturer Part Number: TNPW0402280RBEED; Max Power Dissipation: 63mW; Temperature Coefficient: 25ppm/°C; Supplier: Digikey; Supplier Part Number: 541-TNPW0402280RBEEDCT-ND; RoHS: Yes; Category: Chip SMD Resistors; Stock: 9155; Pricing: 1=0.38, 10=0.272, 50=0.2098, 100=0.1863, 500=0.1394, 1000=0.12239, 5000=0.10368 (USD); Case/Package: 0402; Min Operating Temperature: -55°C; Max Operating Temperature: 125°C; Package Quantity: 10000; Packaging: Tape and Reel; Number of Terminations: 2; Features: Moisture Resistant,Automotive AEC-Q200,Anti-Sulfur; Series: TNPW; Length: 0.039inch; Width: 0.02inch; Height: 0.016inch; RoHS Compliant: Yes; ComponentLink1URL: http://www.vishay.com/docs/28758/tnpw_e3.pdf?src-supplier=Digikey; ComponentLink1Description: http://www.vishay.com/docs/28758/tnpw_e3.pdf?src-supplier=Digikey
footprint R 0402 (1005 Metric) (Chip Capacitor, Body 1.0x0.5mm, IPC High Density)
pins: 1 B, 2 A

## TPD1E1B04DPYR
designator D?
Part Number: TPD1E1B04DPYR
footprint TPD1E10B06QDPYRQ1
pins: A, C

## TPD1E10B06QDPYRQ1
designator D?  (value not drawn)
Automotive 12-pF, ±5.5V ±30-kV ESD protection diode in 0402 Package 2-X1SON -40 to 125; Manufacturer: Texas Instruments; Manufacturer Part Number: TPD1E10B06QDPYRQ1; Value: 12pF; Number of Channels: 1; Supplier: Digi-Key; Supplier Part Number: 296-TPD1E10B06QDPYRQ1CT-ND; RoHS: Yes; Category: TVS Diodes; Stock: 225175; Pricing: 1=0.46000, 10=0.34900, 100=0.21750, 500=0.14882, 1000=0.11448, 2000=0.10303, 5000=0.09731 (USD); Case/Package: 0402; Pins: 2; Min Operating Temperature: -40°C; Max Operating Temperature: 125°C; Lead Free: Lead Free; RoHS Compliant: Yes; ComponentLink1URL: http://www.ti.com/lit/ds/symlink/tpd1e10b06-q1.pdf?src-supplier=Digi-Key; ComponentLink1Description: http://www.ti.com/lit/ds/symlink/tpd1e10b06-q1.pdf?src-supplier=Digi-Key; ComponentLink2URL: http://www.ti.com/general/docs/suppproductinfo.tsp?distId=10&amp;gotoUrl=http%3A%2F%2Fwww.ti.com%2Flit%2Fgpn%2Ftpd1e10b06-q1&src-supplier=Digi-Key; ComponentLink2Description: http://www.ti.com/general/docs/suppproductinfo.tsp?distId=10&amp;gotoUrl=http%3A%2F%2Fwww.ti.com%2Flit%2Fgpn%2Ftpd1e10b06-q1&src-supplier=Digi-Key
footprint TPD1E10B06QDPYRQ1
pins: 1, 2 (power)

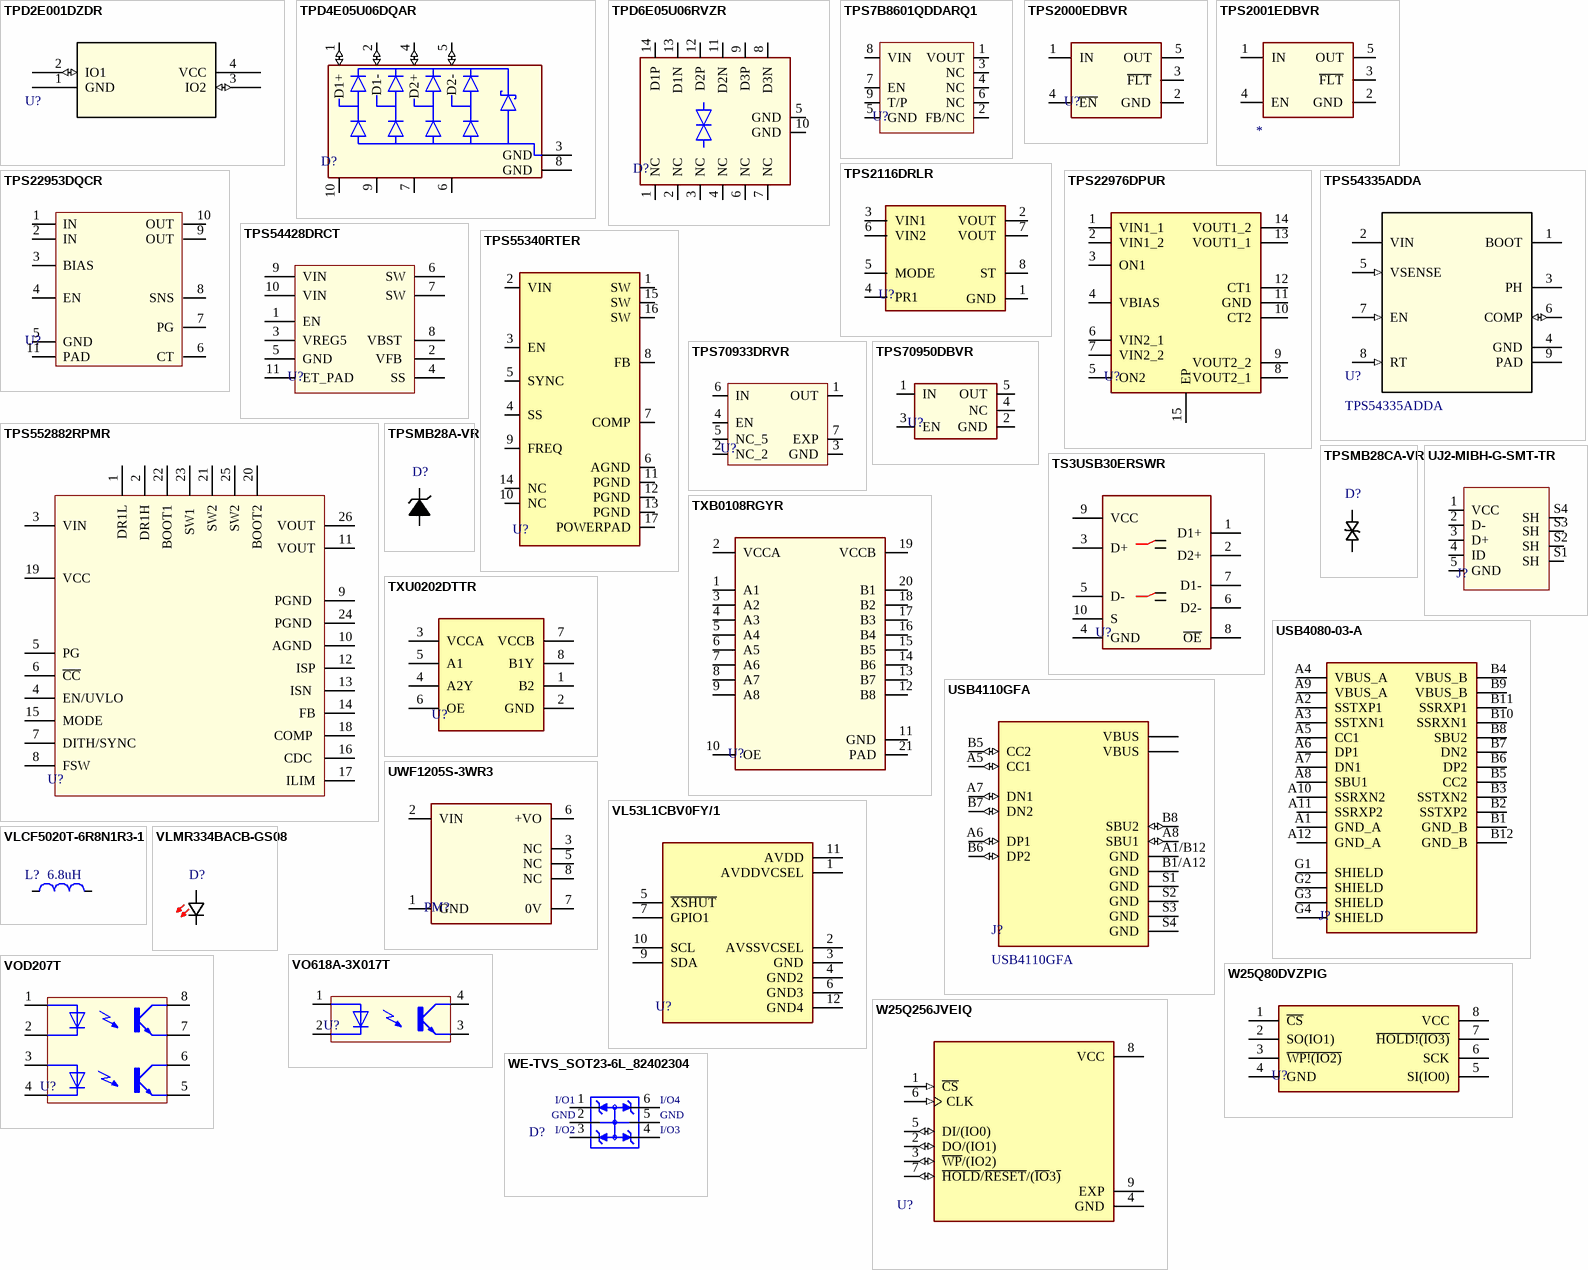
[diagram p20: symbols TPD2E001DZDR to WE-TVS_SOT23-6L_82402304]

## TPD2E001DZDR
designator U?
SRV Series 17.5 V 3 pF SMT RailClamp® Low Capacitance TVS Diode Array SOT-23-6; Manufacturer: Semtech; Manufacturer Part Number: SRV05-4.TCT; Breakdown Voltage: 6V; Value: 5pF; Clamping Voltage: 12.5V; Current: 5A; Direction: Unidirectional; ESD Protection: Yes; Leakage Current: 5µA; Max Power Dissipation: 300W; Number of Bidirectional Channels: 4; Number of Elements: 1; Operating Supply Voltage: 5V; Peak Pulse Current: 12A; Test Current: 1mA; Supplier: Arrow Electronics; Supplier Part Number: SRV05-4.TCT; RoHS: Compliant; Category: TVS Diodes; Stock: 1566000; Pricing: 3000=0.3492 (USD); Case/Package: SOT-23; China RoHS: Compliant; Country of Origin: Mainland China; Depth: 1.6mm; Export Control Classification Number (ECCN) Code: EAR99; Height: 1.15mm; Harmonized Tariff Schedule (HTS) Code: 8541.10.00.50; Introduction Date: 2002-08-22; Lead Free: Lead Free; Length: 2.9mm; Lifecycle Status: Production; Max Breakdown Voltage: 6V; Max Operating Temperature: 125°C; Max Reverse Leakage Current: 5µA; Min Breakdown Voltage: 6V; Min Operating Temperature: -55°C; Mounting Technology: Surface Mount; Number of Channels: 4; Pins: 6; Number of Terminals: 6; Packaging: Cut Tape; Peak Pulse Power: 300W; Polarity: Unidirectional; Power Line Protection: Yes; Power Rating: 300W; Radiation Hardening: No; REACH SVHC: Yes; Reverse Breakdown Voltage: 6V; Reverse Standoff Voltage: 5V; Schedule B: 8542390000, 8542390000|8542390000|8542390000|8542390000|8542390000; Voltage: 5V; Voltage Rating (DC): 5V; Width: 1.6mm; Working Voltage: 5V; ComponentLink1URL: https://datasheet.octopart.com:443/SRV05-4.TCT-Semtech-datasheet-33008608.pdf?src-supplier=IHS; ComponentLink1Description: https://datasheet.octopart.com:443/SRV05-4.TCT-Semtech-datasheet-33008608.pdf?src-supplier=IHS; ComponentLink2URL: https://datasheet.octopart.com:443/SRV05-4.TCT-Semtech-datasheet-604703.pdf?src-supplier=Arrow+Electronics; ComponentLink2Description: https://datasheet.octopart.com:443/SRV05-4.TCT-Semtech-datasheet-604703.pdf?src-supplier=Arrow+Electronics; ComponentLink3URL: https://datasheet.octopart.com:443/SRV05-4.TCT-Semtech-datasheet-41194810.pdf?src-supplier=TME; ComponentLink3Description: https://datasheet.octopart.com:443/SRV05-4.TCT-Semtech-datasheet-41194810.pdf?src-supplier=TME; ComponentLink4URL: https://datasheet.octopart.com:443/SRV05-4.TCT-Semtech-datasheet-10542293.pdf?src-supplier=Farnell; ComponentLink4Description: https://datasheet.octopart.com:443/SRV05-4.TCT-Semtech-datasheet-10542293.pdf?src-supplier=Farnell; ComponentLink5URL: https://datasheet.octopart.com:443/SRV05-4.TCT-Semtech-datasheet-14048601.pdf?src-supplier=iiiC; ComponentLink5Description: https://datasheet.octopart.com:443/SRV05-4.TCT-Semtech-datasheet-14048601.pdf?src-supplier=iiiC
footprint DZD4
pins: 1 GND (power), 2 IO1 (io), 3 IO2 (io), 4 VCC (power)